# Altium footprint library Connectors THD.PcbLib: 631 footprints (part 15 of 46)
Each footprint in its own frame and in the unit in brackets; x right, y up, seen from the top. Pads: shape width x height; smd on the part's side, far side on the other; paste and mask are expansions set on the pad; w line width, h text height; cw(c..) or ccw(c..) is an arc to the next point about the centre after c.
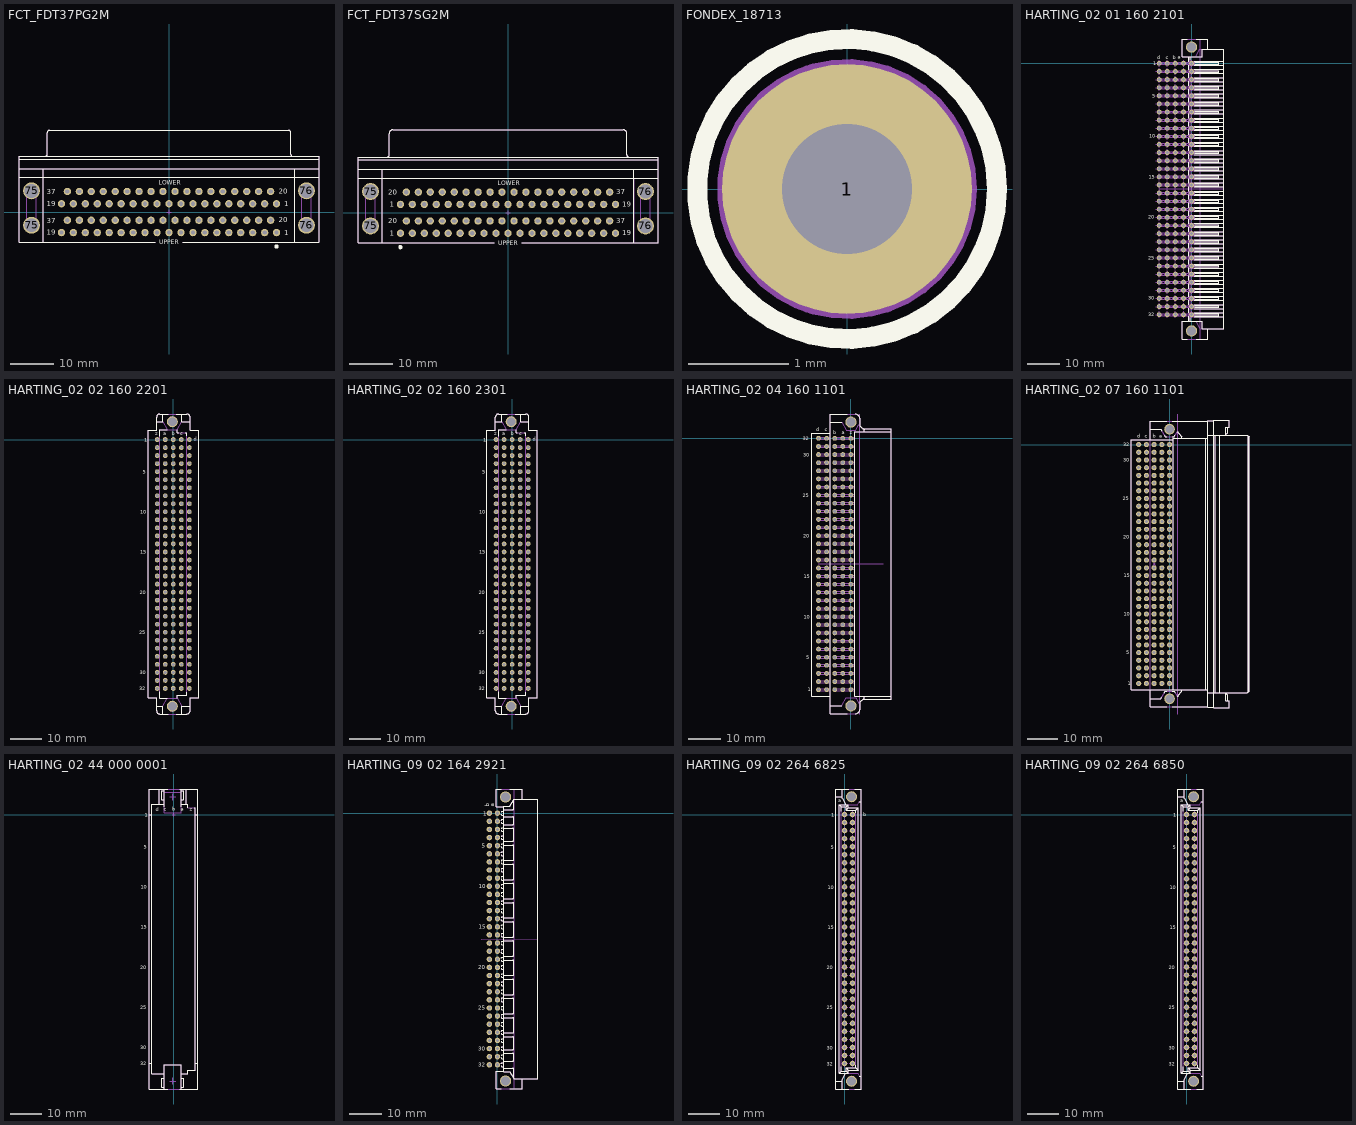
[diagram p14: the footprints below, top view; thin cyan lines are the x and y axes]

## FCT_FDT37PG2M [mm] "Dual Stacked  Right Angled D-SUB 37 Pins Male Connector, With Threaded Insert UNC 4-40, And PCB Mount Retention"
height 31.5
pads (78):
  round 3.9 hole 3.2: 75(-31.75,-3.06) 75(-31.75,4.89) 76(31.75,-3.06) 76(31.75,4.89)
  round 1.7 hole 1: L1(24.84,1.91) L2(22.1,1.91) L3(19.33,1.91) L4(16.56,1.91) L5(13.82,1.91) L6(11.05,1.91) L7(8.28,1.91) L8(5.54,1.91) L9(2.773,1.91) L10(0,1.91) L11(-2.77,1.91) L12(-5.54,1.91) L13(-8.28,1.91) L14(-11.05,1.91) L15(-13.82,1.91) L16(-16.56,1.91) L17(-19.33,1.91) L18(-22.1,1.91) L19(-24.84,1.91) L20(23.47,4.75) L21(20.7,4.75) L22(17.96,4.75) L23(15.19,4.75) L24(12.42,4.75) L25(9.68,4.75) L26(6.91,4.75) L27(4.14,4.75) L28(1.4,4.75) L29(-1.4,4.75) L30(-4.14,4.75) L31(-6.91,4.75) L32(-9.68,4.75) L33(-12.42,4.75) L34(-15.19,4.75) L35(-17.96,4.75) L36(-20.7,4.75) L37(-23.47,4.75) U1(24.84,-4.75) U2(22.1,-4.75) U3(19.33,-4.75) U4(16.56,-4.75) U5(13.82,-4.75) U6(11.05,-4.75) U7(8.28,-4.75) U8(5.54,-4.75) U9(2.773,-4.75) U10(0,-4.75) U11(-2.77,-4.75) U12(-5.54,-4.75) U13(-8.28,-4.75) U14(-11.05,-4.75) U15(-13.82,-4.75) U16(-16.56,-4.75) U17(-19.33,-4.75) U18(-22.1,-4.75) U19(-24.84,-4.75) U20(23.47,-1.91) U21(20.7,-1.91) U22(17.96,-1.91) U23(15.19,-1.91) U24(12.42,-1.91) U25(9.68,-1.91) U26(6.91,-1.91) U27(4.14,-1.91) U28(1.4,-1.91) U29(-1.4,-1.91) U30(-4.14,-1.91) U31(-6.91,-1.91) U32(-9.68,-1.91) U33(-12.42,-1.91) U34(-15.19,-1.91) U35(-17.96,-1.91) U36(-20.7,-1.91) U37(-23.47,-1.91)
Top Overlay:
  circle w0.5: c24.835,-7.955 r0.25
  lines w0.2: -34.65,-6.96 -3.14,-6.96 ; -34.65,-6.96 -34.65,12.84 34.65,12.84 34.65,-6.96 3.14,-6.96 ; -34.65,9.99 34.65,9.99 ; -34.65,12.24 34.65,12.24 ; -34.55,7.99 34.55,7.99 ; -29.05,-6.96 -29.05,7.99 -29.05,9.99 ; -28.65,12.84 ccw(c-28.65,13.34) -28.15,13.34 -28.15,18.34 cw(c-27.65,18.34) -27.65,18.84 27.649,18.84 cw(c27.649,18.34) 28.149,18.34 28.149,13.34 ccw(c28.649,13.34) 28.649,12.84 ; 29.05,-6.96 29.05,6.99 29.05,9.99
  text "UPPER" at -2.21,-7.485 h1
  text "LOWER" at -2.425,6.335 h1
  text "1" at 26.596,-5.352 h1.2
  text "1" at 26.596,1.308 h1.2
  text "20" at 25.369,4.253 h1.2
  text "20" at 25.369,-2.407 h1.2
  text "19" at -28.244,-5.287 h1.2
  text "19" at -28.244,1.373 h1.2
  text "37" at -28.204,4.113 h1.2
  text "37" at -28.204,-2.547 h1.2
Mechanical 8:
  drawing of 320 lines, arcs and shapes, not listed
Mechanical 14:
  lines w0.1: -34.65,-6.96 -34.65,12.84 34.65,12.84 34.65,-6.96 3.14,-6.96 ; -34.65,9.99 34.65,9.99 ; -34.65,12.24 34.65,12.24 ; -34.55,7.99 34.55,7.99 ; -29.05,-6.96 -29.05,7.99 -29.05,9.99 ; -28.65,12.84 ccw(c-28.65,13.34) -28.15,13.34 -28.15,18.34 cw(c-27.65,18.34) -27.65,18.84 27.649,18.84 cw(c27.649,18.34) 28.149,18.34 28.149,13.34 ccw(c28.649,13.34) 28.649,12.84 ; 29.05,-6.96 29.05,6.99 29.05,9.99 ; 30.684,5.09 30.684,-3.26 32.816,-3.26 32.816,5.09 ; 30.72,5.09 32.828,5.09 ; -34.65,-6.96 -3.14,-6.96 -34.65,-6.96 ; -32.816,-3.26 -32.816,5.09 -30.684,5.09 -30.684,-3.26 -32.816,-3.26
  text "UPPER" at -2.21,-7.485 h1
  text "LOWER" at -2.425,6.335 h1
  text "1" at 26.596,-5.352 h1.2
  text "1" at 26.596,1.308 h1.2
  text "20" at 25.369,4.253 h1.2
  text "20" at 25.369,-2.407 h1.2
  text "19" at -28.244,-5.287 h1.2
  text "19" at -28.244,1.373 h1.2
  text "37" at -28.204,4.113 h1.2
  text "37" at -28.204,-2.547 h1.2
3D body: height 31.7, standoff -3.5, extent -34.65,-6.96 34.65,18.84

## FCT_FDT37SG2M [mm] "Dual Stacked  Right Angled D-SUB 37 Pins Female Connector, With Threaded Insert UNC 4-40, And PCB Mount Retention"
height 31.5
pads (78):
  round 3.9 hole 3.2: 75(-31.75,-3.06) 75(-31.75,4.89) 76(31.75,-3.06) 76(31.75,4.89)
  round 1.7 hole 1: L1(-24.84,1.91) L2(-22.1,1.91) L3(-19.33,1.91) L4(-16.56,1.91) L5(-13.82,1.91) L6(-11.05,1.91) L7(-8.28,1.91) L8(-5.54,1.91) L9(-2.773,1.91) L10(0,1.91) L11(2.77,1.91) L12(5.54,1.91) L13(8.28,1.91) L14(11.05,1.91) L15(13.82,1.91) L16(16.56,1.91) L17(19.33,1.91) L18(22.1,1.91) L19(24.84,1.91) L20(-23.47,4.75) L21(-20.7,4.75) L22(-17.96,4.75) L23(-15.19,4.75) L24(-12.42,4.75) L25(-9.68,4.75) L26(-6.91,4.75) L27(-4.14,4.75) L28(-1.4,4.75) L29(1.4,4.75) L30(4.14,4.75) L31(6.91,4.75) L32(9.68,4.75) L33(12.42,4.75) L34(15.19,4.75) L35(17.96,4.75) L36(20.7,4.75) L37(23.47,4.75) U1(-24.84,-4.75) U2(-22.1,-4.75) U3(-19.33,-4.75) U4(-16.56,-4.75) U5(-13.82,-4.75) U6(-11.05,-4.75) U7(-8.28,-4.75) U8(-5.54,-4.75) U9(-2.773,-4.75) U10(0,-4.75) U11(2.77,-4.75) U12(5.54,-4.75) U13(8.28,-4.75) U14(11.05,-4.75) U15(13.82,-4.75) U16(16.56,-4.75) U17(19.33,-4.75) U18(22.1,-4.75) U19(24.84,-4.75) U20(-23.47,-1.91) U21(-20.7,-1.91) U22(-17.96,-1.91) U23(-15.19,-1.91) U24(-12.42,-1.91) U25(-9.68,-1.91) U26(-6.91,-1.91) U27(-4.14,-1.91) U28(-1.4,-1.91) U29(1.4,-1.91) U30(4.14,-1.91) U31(6.91,-1.91) U32(9.68,-1.91) U33(12.42,-1.91) U34(15.19,-1.91) U35(17.96,-1.91) U36(20.7,-1.91) U37(23.47,-1.91)
Top Overlay:
  circle w0.5: c-24.845,-7.955 r0.25
  lines w0.2: -34.65,9.99 34.65,9.99 ; -34.65,12.24 34.65,12.24 ; -34.55,7.99 34.55,7.99 ; -29.05,-6.96 -29.05,9.99 ; -27.949,12.84 ccw(c-27.949,13.34) -27.449,13.34 -27.449,18.265 cw(c-26.574,18.265) -26.574,19.14 26.572,19.14 cw(c26.572,18.265) 27.447,18.265 27.447,13.34 ccw(c27.947,13.34) 27.947,12.84 ; -3.14,-6.96 -34.65,-6.96 -34.65,12.84 34.65,12.84 34.65,-6.96 3.14,-6.96 ; 29.05,-6.96 29.05,9.99
  text "1" at -27.349,-5.287 h1.2
  text "1" at -27.349,1.373 h1.2
  text "37" at 25.016,4.238 h1.2
  text "37" at 25.016,-2.422 h1.2
  text "20" at -27.626,4.188 h1.2
  text "20" at -27.626,-2.472 h1.2
  text "19" at 26.386,-5.262 h1.2
  text "19" at 26.386,1.398 h1.2
  text "UPPER" at -2.21,-7.485 h1
  text "LOWER" at -2.425,6.335 h1
Mechanical 8:
  drawing of 316 lines, arcs and shapes, not listed
Mechanical 14:
  lines w0.1: -34.65,9.99 34.65,9.99 ; -34.65,12.24 34.65,12.24 ; -34.55,7.99 34.55,7.99 ; -29.05,-6.96 -29.05,7.99 -29.05,9.99 ; -27.949,12.84 ccw(c-27.949,13.34) -27.449,13.34 -27.449,18.265 cw(c-26.574,18.265) -26.574,19.14 26.572,19.14 cw(c26.572,18.265) 27.447,18.265 27.447,13.34 ccw(c27.947,13.34) 27.947,12.84 ; 3.14,-6.96 34.65,-6.96 34.65,12.84 -34.65,12.84 -34.65,-6.96 ; 29.05,-6.96 29.05,7.99 29.05,9.99 ; 30.684,5.09 30.684,-3.26 32.816,-3.26 32.816,5.09 ; 30.72,5.09 32.828,5.09 ; -34.65,-6.96 -3.14,-6.96 -34.65,-6.96 ; -32.816,-3.26 -32.816,5.09 -30.684,5.09 -30.684,-3.26 -32.816,-3.26
  text "1" at -27.349,-5.287 h1.2
  text "1" at -27.349,1.373 h1.2
  text "37" at 25.016,4.238 h1.2
  text "37" at 25.016,-2.422 h1.2
  text "20" at -27.626,4.188 h1.2
  text "20" at -27.626,-2.472 h1.2
  text "19" at 26.386,-5.262 h1.2
  text "19" at 26.386,1.398 h1.2
  text "UPPER" at -2.21,-7.485 h1
  text "LOWER" at -2.425,6.335 h1
3D body: height 31.7, standoff -3.5, extent -34.65,-6.96 34.65,19.14

## FONDEX_18713 [mm] "Solder Fork Terminal ( hole 1.3 mm)"
height 4
pads (1):
  round 2.5 hole 1.3: 1(0,0)
Top Overlay:
  circle w0.2: c0,0 r1.5
Mechanical 8:
  lines w0.1: -1,0 0,0 ; 0,-1 0,0 ; 0,1 0,0 ; 1,0 0,0
Mechanical 14:
  circle w0.1: c0,0 r1.25
  lines w0.1: -0.4,-1.184 -0.4,-0.447 ccw(c0,0) 0.4,-0.447 0.4,-1.184 ; -0.4,1.184 -0.4,0.447 cw(c0,0) 0.4,0.447 0.4,1.184
3D body: height 4, standoff -2.6, extent -1.25,-1.25 1.25,1.25

## HARTING_02 01 160 2101 [mm] "PCB connector, DIN 41612, har-bus 64, 160 poles, Angled solder pins, 3.0 mm, Male contacts, Four first mating contacts, Performance level 2 as per IEC 60603-2, Row pitch: 2.54 mm, Without fixing"
height 11.1
pads (162):
  round 1.5 hole 1: a1(-2.54,0) a2(-2.54,-2.54) a3(-2.54,-5.08) a4(-2.54,-7.62) a5(-2.54,-10.16) a6(-2.54,-12.7) a7(-2.54,-15.24) a8(-2.54,-17.78) a9(-2.54,-20.32) a10(-2.54,-22.86) a11(-2.54,-25.4) a12(-2.54,-27.94) a13(-2.54,-30.48) a14(-2.54,-33.02) a15(-2.54,-35.56) a16(-2.54,-38.1) a17(-2.54,-40.64) a18(-2.54,-43.18) a19(-2.54,-45.72) a20(-2.54,-48.26) a21(-2.54,-50.8) a22(-2.54,-53.34) a23(-2.54,-55.88) a24(-2.54,-58.42) a25(-2.54,-60.96) a26(-2.54,-63.5) a27(-2.54,-66.04) a28(-2.54,-68.58) a29(-2.54,-71.12) a30(-2.54,-73.66) a31(-2.54,-76.2) a32(-2.54,-78.74) b1(-5.08,0) b2(-5.08,-2.54) b3(-5.08,-5.08) b4(-5.08,-7.62) b5(-5.08,-10.16) b6(-5.08,-12.7) b7(-5.08,-15.24) b8(-5.08,-17.78) b9(-5.08,-20.32) b10(-5.08,-22.86) b11(-5.08,-25.4) b12(-5.08,-27.94) b13(-5.08,-30.48) b14(-5.08,-33.02) b15(-5.08,-35.56) b16(-5.08,-38.1) b17(-5.08,-40.64) b18(-5.08,-43.18) b19(-5.08,-45.72) b20(-5.08,-48.26) b21(-5.08,-50.8) b22(-5.08,-53.34) b23(-5.08,-55.88) b24(-5.08,-58.42) b25(-5.08,-60.96) b26(-5.08,-63.5) b27(-5.08,-66.04) b28(-5.08,-68.58) b29(-5.08,-71.12) b30(-5.08,-73.66) b31(-5.08,-76.2) b32(-5.08,-78.74) c1(-7.62,0) c2(-7.62,-2.54) c3(-7.62,-5.08) c4(-7.62,-7.62) c5(-7.62,-10.16) c6(-7.62,-12.7) c7(-7.62,-15.24) c8(-7.62,-17.78) c9(-7.62,-20.32) c10(-7.62,-22.86) c11(-7.62,-25.4) c12(-7.62,-27.94) c13(-7.62,-30.48) c14(-7.62,-33.02) c15(-7.62,-35.56) c16(-7.62,-38.1) c17(-7.62,-40.64) c18(-7.62,-43.18) c19(-7.62,-45.72) c20(-7.62,-48.26) c21(-7.62,-50.8) c22(-7.62,-53.34) c23(-7.62,-55.88) c24(-7.62,-58.42) c25(-7.62,-60.96) c26(-7.62,-63.5) c27(-7.62,-66.04) c28(-7.62,-68.58) c29(-7.62,-71.12) c30(-7.62,-73.66) c31(-7.62,-76.2) c32(-7.62,-78.74) d1(-10.16,0) d2(-10.16,-2.54) d3(-10.16,-5.08) d4(-10.16,-7.62) d5(-10.16,-10.16) d6(-10.16,-12.7) d7(-10.16,-15.24) d8(-10.16,-17.78) d9(-10.16,-20.32) d10(-10.16,-22.86) d11(-10.16,-25.4) d12(-10.16,-27.94) d13(-10.16,-30.48) d14(-10.16,-33.02) d15(-10.16,-35.56) d16(-10.16,-38.1) d17(-10.16,-40.64) d18(-10.16,-43.18) d19(-10.16,-45.72) d20(-10.16,-48.26) d21(-10.16,-50.8) d22(-10.16,-53.34) d23(-10.16,-55.88) d24(-10.16,-58.42) d25(-10.16,-60.96) d26(-10.16,-63.5) d27(-10.16,-66.04) d28(-10.16,-68.58) d29(-10.16,-71.12) d30(-10.16,-73.66) d31(-10.16,-76.2) d32(-10.16,-78.74) z1(0,0) z2(0,-2.54) z3(0,-5.08) z4(0,-7.62) z5(0,-10.16) z6(0,-12.7) z7(0,-15.24) z8(0,-17.78) z9(0,-20.32) z10(0,-22.86) z11(0,-25.4) z12(0,-27.94) z13(0,-30.48) z14(0,-33.02) z15(0,-35.56) z16(0,-38.1) z17(0,-40.64) z18(0,-43.18) z19(0,-45.72) z20(0,-48.26) z21(0,-50.8) z22(0,-53.34) z23(0,-55.88) z24(0,-58.42) z25(0,-60.96) z26(0,-63.5) z27(0,-66.04) z28(0,-68.58) z29(0,-71.12) z30(0,-73.66) z31(0,-76.2) z32(0,-78.74)
  round 3.5 / inner round 3.5 / far side round 5.1 hole 2.8: MTG1(0,5.08) MTG2(0,-83.82)
Top Overlay:
  drawing of 219 lines, arcs and shapes, not listed
  text "c" at -8.053,1.342 h1.2
  text "b" at -5.961,1.342 h1.2
  text "a" at -4.321,1.392 h1.2
  text "d" at -10.72,1.342 h1.2
  text "30" at -13.555,-73.03 h1.2
  text "25" at -13.62,-61.545 h1.2
  text "20" at -13.555,-48.77 h1.2
  text "15" at -13.375,-36.11 h1.2
  text "10" at -13.325,-23.385 h1.2
  text "5" at -12.405,-10.725 h1.2
  text "32" at -13.62,-79.32 h1.2
  text "1" at -12.05,-0.595 h1.2
Mechanical 8:
  drawing of 650 lines, arcs and shapes, not listed
  text "PCB" at 2.54,-41.275 h1.5
Mechanical 14:
  drawing of 308 lines, arcs and shapes, not listed
  text "z" at -0.127,1.067 h1.2
  text "d" at -10.72,1.342 h1.2
  text "a" at -4.321,1.392 h1.2
  text "b" at -5.961,1.342 h1.2
  text "c" at -8.053,1.342 h1.2
  text "30" at -13.555,-73.03 h1.2
  text "25" at -13.62,-61.545 h1.2
  text "20" at -13.555,-48.77 h1.2
  text "15" at -13.375,-36.11 h1.2
  text "10" at -13.325,-23.385 h1.2
  text "5" at -12.405,-10.725 h1.2
  text "32" at -13.62,-79.32 h1.2
  text "1" at -12.05,-0.595 h1.2
3D body: height 9.55, standoff -3, extent -10.46,-86.37 10.1,7.63

## HARTING_02 02 160 2201 [mm] "Backplane Connector; Har-bus 64, Thru-Hole; Rows z+a+b+c+d, Press-in 160 Female Contacts"
height 11.6
pads (162):
  round 1.5 hole 1: a1(-2.54,0) a2(-2.54,-2.54) a3(-2.54,-5.08) a4(-2.54,-7.62) a5(-2.54,-10.16) a6(-2.54,-12.7) a7(-2.54,-15.24) a8(-2.54,-17.78) a9(-2.54,-20.32) a10(-2.54,-22.86) a11(-2.54,-25.4) a12(-2.54,-27.94) a13(-2.54,-30.48) a14(-2.54,-33.02) a15(-2.54,-35.56) a16(-2.54,-38.1) a17(-2.54,-40.64) a18(-2.54,-43.18) a19(-2.54,-45.72) a20(-2.54,-48.26) a21(-2.54,-50.8) a22(-2.54,-53.34) a23(-2.54,-55.88) a24(-2.54,-58.42) a25(-2.54,-60.96) a26(-2.54,-63.5) a27(-2.54,-66.04) a28(-2.54,-68.58) a29(-2.54,-71.12) a30(-2.54,-73.66) a31(-2.54,-76.2) a32(-2.54,-78.74) b1(0,0) b2(0,-2.54) b3(0,-5.08) b4(0,-7.62) b5(0,-10.16) b6(0,-12.7) b7(0,-15.24) b8(0,-17.78) b9(0,-20.32) b10(0,-22.86) b11(0,-25.4) b12(0,-27.94) b13(0,-30.48) b14(0,-33.02) b15(0,-35.56) b16(0,-38.1) b17(0,-40.64) b18(0,-43.18) b19(0,-45.72) b20(0,-48.26) b21(0,-50.8) b22(0,-53.34) b23(0,-55.88) b24(0,-58.42) b25(0,-60.96) b26(0,-63.5) b27(0,-66.04) b28(0,-68.58) b29(0,-71.12) b30(0,-73.66) b31(0,-76.2) b32(0,-78.74) c1(2.54,0) c2(2.54,-2.54) c3(2.54,-5.08) c4(2.54,-7.62) c5(2.54,-10.16) c6(2.54,-12.7) c7(2.54,-15.24) c8(2.54,-17.78) c9(2.54,-20.32) c10(2.54,-22.86) c11(2.54,-25.4) c12(2.54,-27.94) c13(2.54,-30.48) c14(2.54,-33.02) c15(2.54,-35.56) c16(2.54,-38.1) c17(2.54,-40.64) c18(2.54,-43.18) c19(2.54,-45.72) c20(2.54,-48.26) c21(2.54,-50.8) c22(2.54,-53.34) c23(2.54,-55.88) c24(2.54,-58.42) c25(2.54,-60.96) c26(2.54,-63.5) c27(2.54,-66.04) c28(2.54,-68.58) c29(2.54,-71.12) c30(2.54,-73.66) c31(2.54,-76.2) c32(2.54,-78.74) d1(5.08,0) d2(5.08,-2.54) d3(5.08,-5.08) d4(5.08,-7.62) d5(5.08,-10.16) d6(5.08,-12.7) d7(5.08,-15.24) d8(5.08,-17.78) d9(5.08,-20.32) d10(5.08,-22.86) d11(5.08,-25.4) d12(5.08,-27.94) d13(5.08,-30.48) d14(5.08,-33.02) d15(5.08,-35.56) d16(5.08,-38.1) d17(5.08,-40.64) d18(5.08,-43.18) d19(5.08,-45.72) d20(5.08,-48.26) d21(5.08,-50.8) d22(5.08,-53.34) d23(5.08,-55.88) d24(5.08,-58.42) d25(5.08,-60.96) d26(5.08,-63.5) d27(5.08,-66.04) d28(5.08,-68.58) d29(5.08,-71.12) d30(5.08,-73.66) d31(5.08,-76.2) d32(5.08,-78.74) z1(-5.08,0) z2(-5.08,-2.54) z3(-5.08,-5.08) z4(-5.08,-7.62) z5(-5.08,-10.16) z6(-5.08,-12.7) z7(-5.08,-15.24) z8(-5.08,-17.78) z9(-5.08,-20.32) z10(-5.08,-22.86) z11(-5.08,-25.4) z12(-5.08,-27.94) z13(-5.08,-30.48) z14(-5.08,-33.02) z15(-5.08,-35.56) z16(-5.08,-38.1) z17(-5.08,-40.64) z18(-5.08,-43.18) z19(-5.08,-45.72) z20(-5.08,-48.26) z21(-5.08,-50.8) z22(-5.08,-53.34) z23(-5.08,-55.88) z24(-5.08,-58.42) z25(-5.08,-60.96) z26(-5.08,-63.5) z27(-5.08,-66.04) z28(-5.08,-68.58) z29(-5.08,-71.12) z30(-5.08,-73.66) z31(-5.08,-76.2) z32(-5.08,-78.74)
  round 3.5 / inner round 3.5 / far side round 5.1 hole 2.8: MTG1(-0.3,5.63) MTG2(-0.3,-84.37)
Top Overlay:
  lines w0.2: -5.3,-84.395 -3.3,-84.395 -3.3,-86.82 ; -5.3,5.655 -3.3,5.655 -3.3,8.08 ; -4.25,-79.85 -4.25,-81.87 -1.9,-81.87 ; -4.25,1.11 -4.25,3.13 -1.9,3.13 ; -1.6,-86.82 -3.325,-86.82 -4.3,-86.82 cw(c-4.3,-85.82) -5.3,-85.82 -5.3,-84.37 -5.3,-81.725 -8,-81.725 -8,2.985 -5.3,2.985 -5.3,5.63 -5.3,7.08 cw(c-4.3,7.08) -4.3,8.08 -3.325,8.08 -1.6,8.08 ; 1,-86.82 2.725,-86.82 4.3,-86.82 ccw(c4.3,-85.82) 5.3,-85.82 5.3,-84.37 5.3,-81.725 8,-81.725 8,2.985 5.3,2.985 5.3,5.655 2.7,5.655 2.7,8.08 ; 1,8.08 2.725,8.08 4.3,8.08 cw(c4.3,7.08) 5.3,7.08 5.3,5.63 ; 1.25,-81.87 1.25,-80.87 4.25,-80.87 4.25,-80.01 ; 1.25,3.13 1.25,2.13 1.69,2.13 ; 2.7,-86.82 2.7,-84.395 5.3,-84.395 ; 3.81,2.13 4.25,2.13 4.25,1.27
  text "30" at -10.675,-74.3 h1.2
  text "25" at -10.725,-61.6 h1.2
  text "20" at -10.675,-48.875 h1.2
  text "15" at -10.495,-36.185 h1.2
  text "10" at -10.495,-23.485 h1.2
  text "5" at -9.625,-10.795 h1.2
  text "32" at -10.7,-79.375 h1.2
  text "b" at -0.425,1.4 h1.2
  text "a" at -3.14,1.39 h1.2
  text "z" at -5.725,1.375 h1.2
  text "1" at -9.17,-0.675 h1.2
  text "c" at 2.275,1.425 h1.2
  text "d" at 6.475,-0.45 h1.2
Mechanical 8:
  lines w0.1: -1.3,-84.37 -0.3,-84.37 ; -1.3,5.63 -0.3,5.63 ; -0.3,-85.37 -0.3,-84.37 ; -0.3,-83.37 -0.3,-84.37 ; -0.3,4.63 -0.3,5.63 ; -0.3,6.63 -0.3,5.63 ; 0.7,-84.37 -0.3,-84.37 ; 0.7,5.63 -0.3,5.63
Mechanical 14:
  circle w0.1: c-0.3,5.63 r1.425
  circle w0.1: c-0.3,-84.37 r1.425
  lines w0.1: -5.3,-84.395 -3.3,-84.395 ; -5.3,5.655 -3.3,5.655 ; -3.3,-86.82 -3.3,-84.395 ; -3.3,8.08 -3.3,5.655 ; -1.85,-81.87 -3.3,-84.395 ; -1.85,3.13 -3.3,5.655 ; -1.817,-81.87 1.217,-81.87 ; -1.817,3.13 1.217,3.13 ; 2.7,-86.82 2.7,-84.395 ; 2.7,8.08 2.7,5.655 ; 5.3,-84.395 2.7,-84.395 ; 5.3,5.63 5.3,7.08 ccw(c4.3,7.08) 4.3,8.08 2.725,8.08 -3.325,8.08 -4.3,8.08 ccw(c-4.3,7.08) -5.3,7.08 -5.3,5.63 -5.3,2.985 -8,2.985 -8,-81.725 -5.3,-81.725 -5.3,-84.37 -5.3,-85.82 ccw(c-4.3,-85.82) -4.3,-86.82 -3.325,-86.82 2.725,-86.82 4.3,-86.82 ccw(c4.3,-85.82) 5.3,-85.82 5.3,-84.37 5.3,-81.725 8,-81.725 8,2.985 5.3,2.985 5.3,5.655 2.7,5.655 ; 1.25,-81.87 1.25,-80.87 4.25,-80.87 4.25,2.13 1.25,2.13 1.25,3.13 ; 1.25,-81.87 -4.25,-81.87 -4.25,3.13 1.25,3.13 ; 1.25,-81.87 2.7,-84.395 ; 1.25,3.13 2.7,5.655
  text "1" at -9.17,-0.675 h1.2
  text "32" at -10.7,-79.375 h1.2
  text "5" at -9.625,-10.795 h1.2
  text "10" at -10.495,-23.485 h1.2
  text "15" at -10.495,-36.185 h1.2
  text "20" at -10.675,-48.875 h1.2
  text "25" at -10.725,-61.6 h1.2
  text "30" at -10.675,-74.3 h1.2
  text "b" at -0.425,1.4 h1.2
  text "a" at -3.14,1.39 h1.2
  text "z" at -5.725,1.375 h1.2
  text "c" at 2.275,1.425 h1.2
  text "d" at 6.475,-0.45 h1.2
Drill Drawing:
  lines w0.1: -7.62,-58.42 -7.62,-81.28 7.62,-81.28 7.62,2.54 -7.62,2.54 -7.62,-20.32
  text "PRESS-FIT TECHNOLOGY diam. 1mm +0.1 -0" at -6.985,-56.515 h1
3D body: height 11.6, standoff -4.95, extent -8,-86.82 8,8.08

## HARTING_02 02 160 2301 [mm] "Backplane Connector; Har-bus 64, 17mm Pres-in Terminations; Rows z+a+b+c+d, Press-in 160 Female Contacts"
height 11.6
pads (162):
  round 1.5 hole 1: a1(-2.54,0) a2(-2.54,-2.54) a3(-2.54,-5.08) a4(-2.54,-7.62) a5(-2.54,-10.16) a6(-2.54,-12.7) a7(-2.54,-15.24) a8(-2.54,-17.78) a9(-2.54,-20.32) a10(-2.54,-22.86) a11(-2.54,-25.4) a12(-2.54,-27.94) a13(-2.54,-30.48) a14(-2.54,-33.02) a15(-2.54,-35.56) a16(-2.54,-38.1) a17(-2.54,-40.64) a18(-2.54,-43.18) a19(-2.54,-45.72) a20(-2.54,-48.26) a21(-2.54,-50.8) a22(-2.54,-53.34) a23(-2.54,-55.88) a24(-2.54,-58.42) a25(-2.54,-60.96) a26(-2.54,-63.5) a27(-2.54,-66.04) a28(-2.54,-68.58) a29(-2.54,-71.12) a30(-2.54,-73.66) a31(-2.54,-76.2) a32(-2.54,-78.74) b1(0,0) b2(0,-2.54) b3(0,-5.08) b4(0,-7.62) b5(0,-10.16) b6(0,-12.7) b7(0,-15.24) b8(0,-17.78) b9(0,-20.32) b10(0,-22.86) b11(0,-25.4) b12(0,-27.94) b13(0,-30.48) b14(0,-33.02) b15(0,-35.56) b16(0,-38.1) b17(0,-40.64) b18(0,-43.18) b19(0,-45.72) b20(0,-48.26) b21(0,-50.8) b22(0,-53.34) b23(0,-55.88) b24(0,-58.42) b25(0,-60.96) b26(0,-63.5) b27(0,-66.04) b28(0,-68.58) b29(0,-71.12) b30(0,-73.66) b31(0,-76.2) b32(0,-78.74) c1(2.54,0) c2(2.54,-2.54) c3(2.54,-5.08) c4(2.54,-7.62) c5(2.54,-10.16) c6(2.54,-12.7) c7(2.54,-15.24) c8(2.54,-17.78) c9(2.54,-20.32) c10(2.54,-22.86) c11(2.54,-25.4) c12(2.54,-27.94) c13(2.54,-30.48) c14(2.54,-33.02) c15(2.54,-35.56) c16(2.54,-38.1) c17(2.54,-40.64) c18(2.54,-43.18) c19(2.54,-45.72) c20(2.54,-48.26) c21(2.54,-50.8) c22(2.54,-53.34) c23(2.54,-55.88) c24(2.54,-58.42) c25(2.54,-60.96) c26(2.54,-63.5) c27(2.54,-66.04) c28(2.54,-68.58) c29(2.54,-71.12) c30(2.54,-73.66) c31(2.54,-76.2) c32(2.54,-78.74) d1(5.08,0) d2(5.08,-2.54) d3(5.08,-5.08) d4(5.08,-7.62) d5(5.08,-10.16) d6(5.08,-12.7) d7(5.08,-15.24) d8(5.08,-17.78) d9(5.08,-20.32) d10(5.08,-22.86) d11(5.08,-25.4) d12(5.08,-27.94) d13(5.08,-30.48) d14(5.08,-33.02) d15(5.08,-35.56) d16(5.08,-38.1) d17(5.08,-40.64) d18(5.08,-43.18) d19(5.08,-45.72) d20(5.08,-48.26) d21(5.08,-50.8) d22(5.08,-53.34) d23(5.08,-55.88) d24(5.08,-58.42) d25(5.08,-60.96) d26(5.08,-63.5) d27(5.08,-66.04) d28(5.08,-68.58) d29(5.08,-71.12) d30(5.08,-73.66) d31(5.08,-76.2) d32(5.08,-78.74) z1(-5.08,0) z2(-5.08,-2.54) z3(-5.08,-5.08) z4(-5.08,-7.62) z5(-5.08,-10.16) z6(-5.08,-12.7) z7(-5.08,-15.24) z8(-5.08,-17.78) z9(-5.08,-20.32) z10(-5.08,-22.86) z11(-5.08,-25.4) z12(-5.08,-27.94) z13(-5.08,-30.48) z14(-5.08,-33.02) z15(-5.08,-35.56) z16(-5.08,-38.1) z17(-5.08,-40.64) z18(-5.08,-43.18) z19(-5.08,-45.72) z20(-5.08,-48.26) z21(-5.08,-50.8) z22(-5.08,-53.34) z23(-5.08,-55.88) z24(-5.08,-58.42) z25(-5.08,-60.96) z26(-5.08,-63.5) z27(-5.08,-66.04) z28(-5.08,-68.58) z29(-5.08,-71.12) z30(-5.08,-73.66) z31(-5.08,-76.2) z32(-5.08,-78.74)
  round 3.5 / inner round 3.5 / far side round 5.1 hole 2.8: MTG1(-0.3,5.63) MTG2(-0.3,-84.37)
Top Overlay:
  lines w0.2: -5.3,-84.395 -3.3,-84.395 -3.3,-86.82 ; -5.3,5.655 -3.3,5.655 -3.3,8.08 ; -4.25,-79.85 -4.25,-81.87 -1.9,-81.87 ; -4.25,1.11 -4.25,3.13 -1.9,3.13 ; -1.6,-86.82 -3.325,-86.82 -4.3,-86.82 cw(c-4.3,-85.82) -5.3,-85.82 -5.3,-84.37 -5.3,-81.725 -8,-81.725 -8,2.985 -5.3,2.985 -5.3,5.63 -5.3,7.08 cw(c-4.3,7.08) -4.3,8.08 -3.325,8.08 -1.6,8.08 ; 1,-86.82 2.725,-86.82 4.3,-86.82 ccw(c4.3,-85.82) 5.3,-85.82 5.3,-84.37 5.3,-81.725 8,-81.725 8,2.985 5.3,2.985 5.3,5.655 2.7,5.655 2.7,8.08 ; 1,8.08 2.725,8.08 4.3,8.08 cw(c4.3,7.08) 5.3,7.08 5.3,5.63 ; 1.25,-81.87 1.25,-80.87 4.25,-80.87 4.25,-80.01 ; 1.25,3.13 1.25,2.13 1.69,2.13 ; 2.7,-86.82 2.7,-84.395 5.3,-84.395 ; 3.81,2.13 4.25,2.13 4.25,1.27
  text "d" at 6.475,-0.45 h1.2
  text "c" at 2.275,1.425 h1.2
  text "z" at -5.725,1.375 h1.2
  text "a" at -3.14,1.39 h1.2
  text "b" at -0.425,1.4 h1.2
  text "1" at -9.07,-0.675 h1.2
  text "32" at -10.6,-79.375 h1.2
  text "5" at -9.525,-10.795 h1.2
  text "10" at -10.395,-23.485 h1.2
  text "15" at -10.395,-36.185 h1.2
  text "20" at -10.575,-48.875 h1.2
  text "25" at -10.625,-61.6 h1.2
  text "30" at -10.575,-74.3 h1.2
Mechanical 8:
  lines w0.1: -1.3,-84.37 -0.3,-84.37 ; -1.3,5.63 -0.3,5.63 ; -0.3,-85.37 -0.3,-84.37 ; -0.3,-83.37 -0.3,-84.37 ; -0.3,4.63 -0.3,5.63 ; -0.3,6.63 -0.3,5.63 ; 0.7,-84.37 -0.3,-84.37 ; 0.7,5.63 -0.3,5.63
Mechanical 14:
  circle w0.1: c-0.3,-84.37 r1.425
  circle w0.1: c-0.3,5.63 r1.425
  lines w0.1: -5.3,-84.395 -3.3,-84.395 ; -5.3,5.655 -3.3,5.655 ; -3.3,-86.82 -3.3,-84.395 ; -3.3,8.08 -3.3,5.655 ; -1.85,-81.87 -3.3,-84.395 ; -1.85,3.13 -3.3,5.655 ; -1.817,-81.87 1.217,-81.87 ; -1.817,3.13 1.217,3.13 ; 2.7,-86.82 2.7,-84.395 ; 2.7,8.08 2.7,5.655 ; 5.3,-84.395 2.7,-84.395 ; 5.3,5.63 5.3,7.08 ccw(c4.3,7.08) 4.3,8.08 2.725,8.08 -3.325,8.08 -4.3,8.08 ccw(c-4.3,7.08) -5.3,7.08 -5.3,5.63 -5.3,2.985 -8,2.985 -8,-81.725 -5.3,-81.725 -5.3,-84.37 -5.3,-85.82 ccw(c-4.3,-85.82) -4.3,-86.82 -3.325,-86.82 2.725,-86.82 4.3,-86.82 ccw(c4.3,-85.82) 5.3,-85.82 5.3,-84.37 5.3,-81.725 8,-81.725 8,2.985 5.3,2.985 5.3,5.655 2.7,5.655 ; 1.25,-81.87 2.7,-84.395 ; 1.25,-81.87 -4.25,-81.87 -4.25,3.13 1.25,3.13 ; 1.25,-81.87 1.25,-80.87 4.25,-80.87 4.25,2.13 1.25,2.13 1.25,3.13 ; 1.25,3.13 2.7,5.655